# Altium footprint library Mine.PcbLib: 306 footprints (part 18 of 20)
Each footprint in its own frame and in the unit in brackets; x right, y up, seen from the top. Pads: shape width x height; smd on the part's side, far side on the other; paste and mask are expansions set on the pad; w line width, h text height; cw(c..) or ccw(c..) is an arc to the next point about the centre after c.
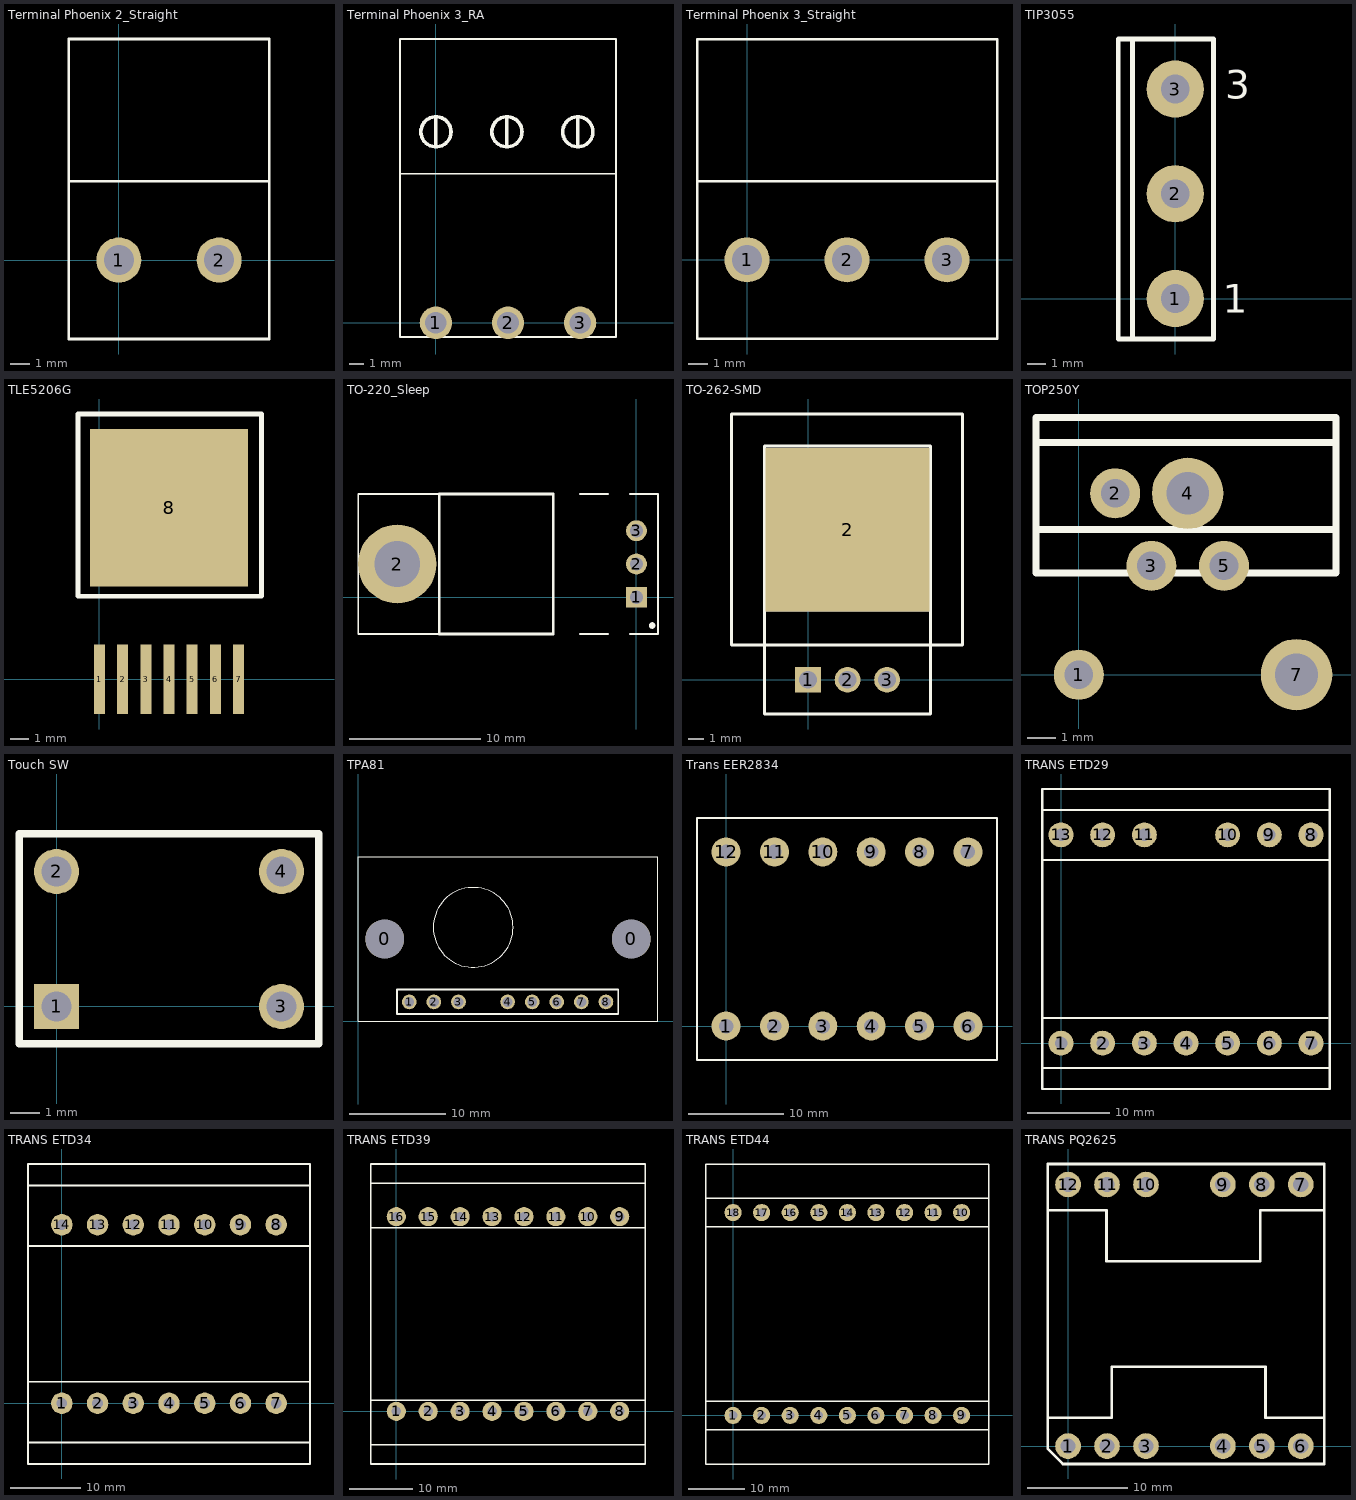
[diagram p17: the footprints below, top view; thin cyan lines are the x and y axes]

## Terminal Phoenix 2_Straight [mil] "2EDGK-5.08"
height 590.55
pads (2):
  round 90 hole 60: 1(0,0) 2(200,0)
Top Overlay:
  lines w5: -100,157.48 298.43,157.48 ; -100,-157.48 300,-157.48 300,440.94 -100,440.94 -100,-157.48

## Terminal Phoenix 3_RA [mil] "2EDGK-5.08"
height 590.55
pads (3):
  round 90 hole 60: 1(0,0) 2(200,0) 3(400,0)
Top Overlay:
  circle w10: c0,529.92 r41.85
  circle w10: c196.85,529.92 r41.85
  circle w10: c393.7,529.92 r41.85
  lines w5: -98.43,413.39 500,413.39 ; -100,-39.37 -100,787.4 500,787.4 500,-39.37 -100,-39.37
  lines w10: 0,490.55 0,569.29 ; 196.85,490.55 196.85,569.29 ; 393.7,490.55 393.7,569.29

## Terminal Phoenix 3_Straight [mil] "2EDGK-5.08"
height 590.55
pads (3):
  round 90 hole 60: 1(0,0) 2(200,0) 3(400,0)
Top Overlay:
  lines w5: -100,157.48 500,157.48 ; -100,-157.48 500,-157.48 500,440.94 -100,440.94 -100,-157.48

## TIP3055 [mil]
pads (3):
  round 120 hole 60: 1(0,0) 2(0,220) 3(0,440)
Top Overlay:
  lines w10: -90,-85 -90,290 -90,545 ; -90,-85 80,-85 80,545 -90,545 ; -90,-85 -95,-85 -120,-85 -120,545 -90,545
  text "1" at 100,-30 h60
  text "3" at 105,420 h60

## TLE5206G [mm]
pads (8):
  rect 0.6x3.81 smd: 1(0,0) 2(1.27,0) 3(2.54,0) 4(3.81,0) 5(5.08,0) 6(6.35,0) 7(7.62,0)
  rect 8.636x8.636 smd: 8(3.81,9.398)
Top Overlay:
  circle w0.254: c3.88,8.992 r2.014
  lines w0.254: -1.18,4.54 8.88,4.54 8.88,14.54 -1.18,14.54 -1.18,4.54

## TO-220_Sleep [mm]
height 4.8
pads (4):
  rect 1.6x1.6 hole 1: 1(0,0)
  round 6 hole 3.5: 2(-18.27,2.54)
  round 1.6 hole 1: 2(0,2.54) 3(0,5.08)
Top Overlay:
  circle w0.25: c1.2,-2.16 r0.125
  lines w0.127: -15.05,-2.81 -21.25,-2.81 -21.25,7.89 -15.05,7.89 ; -4.318,-2.81 -2.159,-2.81 ; -4.318,7.89 -2.159,7.89 ; -0.508,-2.81 1.651,-2.81 1.651,7.89 -0.508,7.89
  lines w0.2: -15.057,-2.81 -6.35,-2.81 -6.35,7.89 -15.057,7.89 ; -15.05,-2.81 -15.05,7.89
Mechanical 15:
  lines w0.1: -0.5,2.54 0.5,2.54 ; 0,2.04 0,3.04

## TO-262-SMD [mil]
height 196.85
pads (4):
  rect 65x65 hole 45: 1(0,0)
  round 65 hole 45: 2(100,0) 3(200,0)
  rect 414.96x414.96 smd: 2(100,380)
Top Overlay:
  lines w7: -193.86,87.99 -193.86,672.99 391.14,672.99 391.14,87.99 -193.86,87.99
  lines w7.87: -110,177.17 310,177.17 ; -110,-86.61 310,-86.61 310,592.13 -110,592.13 -110,-86.61

## TOP250Y [mil]
pads (6):
  round 70 hole 40: 1(0,0) 2(50.8,254) 3(101.6,152.4) 5(203.2,152.4)
  round 100 hole 60: 4(152.4,254) 7(304.8,0)
Top Overlay:
  lines w10: -60,203.2 360,203.2 ; -60,325.2 -60,142.4 360,142.4 360,325.2 ; -60,325.2 360,325.2 ; -60,325.2 -60,360 360,360 360,325.2

## Touch SW [mil]
pads (4):
  rect 60x60 hole 40: 1(0,0)
  round 60 hole 40: 2(0,180) 3(300,0) 4(300,180)
Top Overlay:
  lines w10: -50,-50 350,-50 350,230 0,230 -50,230 -50,-50

## TPA81 [mm]
height 14
pads (10):
  round 4 hole 4: 0(2.75,8.5) 0(28.25,8.5)
  round 1.524 hole 1.016: 1(5.3,2) 2(7.84,2) 3(10.38,2) 4(15.46,2) 5(18,2) 6(20.54,2) 7(23.08,2) 8(25.62,2)
Top Overlay:
  circle w0.127: c11.9,9.7 r4.125
  lines w0.127: 0,0 31,0 31,17 0,17 0,0
  lines w0.2: 4.03,0.73 26.89,0.73 26.89,3.27 4.03,3.27 4.03,0.73

## Trans EER2834 [mil]
pads (12):
  round 120 hole 60: 1(0,0) 2(200,0) 3(400,0) 4(600,0) 5(800,0) 6(1000,0) 7(1000,720) 8(800,720) 9(600,720) 10(400,720) 11(200,720) 12(0,720)
Top Overlay:
  lines w10: -120,-140 1120,-140 1120,860 -120,860 -120,-140

## TRANS ETD29 [mil]
pads (13):
  round 120 hole 60: 1(0,0) 2(200,0) 3(400,0) 4(600,0) 5(800,0) 6(1000,0) 7(1200,0) 8(1200,1000) 9(1000,1000) 10(800,1000) 11(400,1000) 12(200,1000) 13(0,1000)
Top Overlay:
  lines w10: -90,-120 1290,-120 ; -90,120 1280,120 ; -90,880 1290,880 ; -90,1120 1290,1120 ; -90,-220 -90,1220 1290,1220 1290,-220 -90,-220

## TRANS ETD34 [mil]
pads (14):
  round 120 hole 60: 1(0,0) 2(200,0) 3(400,0) 4(600,0) 5(800,0) 6(1000,0) 7(1200,0) 8(1200,1000) 9(1000,1000) 10(800,1000) 11(600,1000) 12(400,1000) 13(200,1000) 14(0,1000)
Top Overlay:
  lines w10: -190,-220 1390,-220 ; -190,120 1390,120 ; -190,880 1390,880 ; -190,1220 1390,1220 ; -190,-340 -190,1340 1390,1340 1390,-340 -190,-340

## TRANS ETD39 [mil]
pads (16):
  round 120 hole 60: 1(0,0) 2(200,0) 3(400,0) 4(600,0) 5(800,0) 6(1000,0) 7(1200,0) 8(1400,0) 9(1400,1220) 10(1200,1220) 11(1000,1220) 12(800,1220) 13(600,1220) 14(400,1220) 15(200,1220) 16(0,1220)
Top Overlay:
  lines w10: -160,-210 1560,-210 ; -160,70 1560,70 ; -160,1150 1560,1150 ; -160,1430 1555,1430 ; -160,-330 -160,1550 1560,1550 1560,-330 -160,-330

## TRANS ETD44 [mil]
pads (18):
  round 120 hole 60: 1(0,0) 2(200,0) 3(400,0) 4(600,0) 5(800,0) 6(1000,0) 7(1200,0) 8(1400,0) 9(1600,0) 10(1600,1420) 11(1400,1420) 12(1200,1420) 13(1000,1420) 14(800,1420) 15(600,1420) 16(400,1420) 17(200,1420) 18(0,1420)
Top Overlay:
  lines w10: -195,100 1785,100 ; -190,-100 1790,-100 ; -190,1320 1785,1320 ; -185,1520 1785,1520 ; -190,-340 -190,1760 1790,1760 1790,-340 -190,-340

## TRANS PQ2625 [mil]
pads (12):
  round 100 hole 60: 1(0,0) 2(152,0) 3(304,0) 4(604,0) 5(756,0) 6(908,0) 7(908,1020) 8(756,1020) 9(604,1020) 10(304,1020) 11(152,1020) 12(0,1020)
Top Overlay:
  lines w10: -80,110 170,110 170,310 770,310 770,110 1000,110 ; -80,920 150,920 150,720 750,720 750,920 1000,920 ; -80,-10 -80,1100 1000,1100 1000,-70 -20,-70 -80,-10